# Altium footprint library SCT8-Board.PcbLib: 132 footprints (part 4 of 9)
Each footprint in its own frame and in the unit in brackets; x right, y up, seen from the top. Pads: shape width x height; smd on the part's side, far side on the other; paste and mask are expansions set on the pad; w line width, h text height; cw(c..) or ccw(c..) is an arc to the next point about the centre after c.
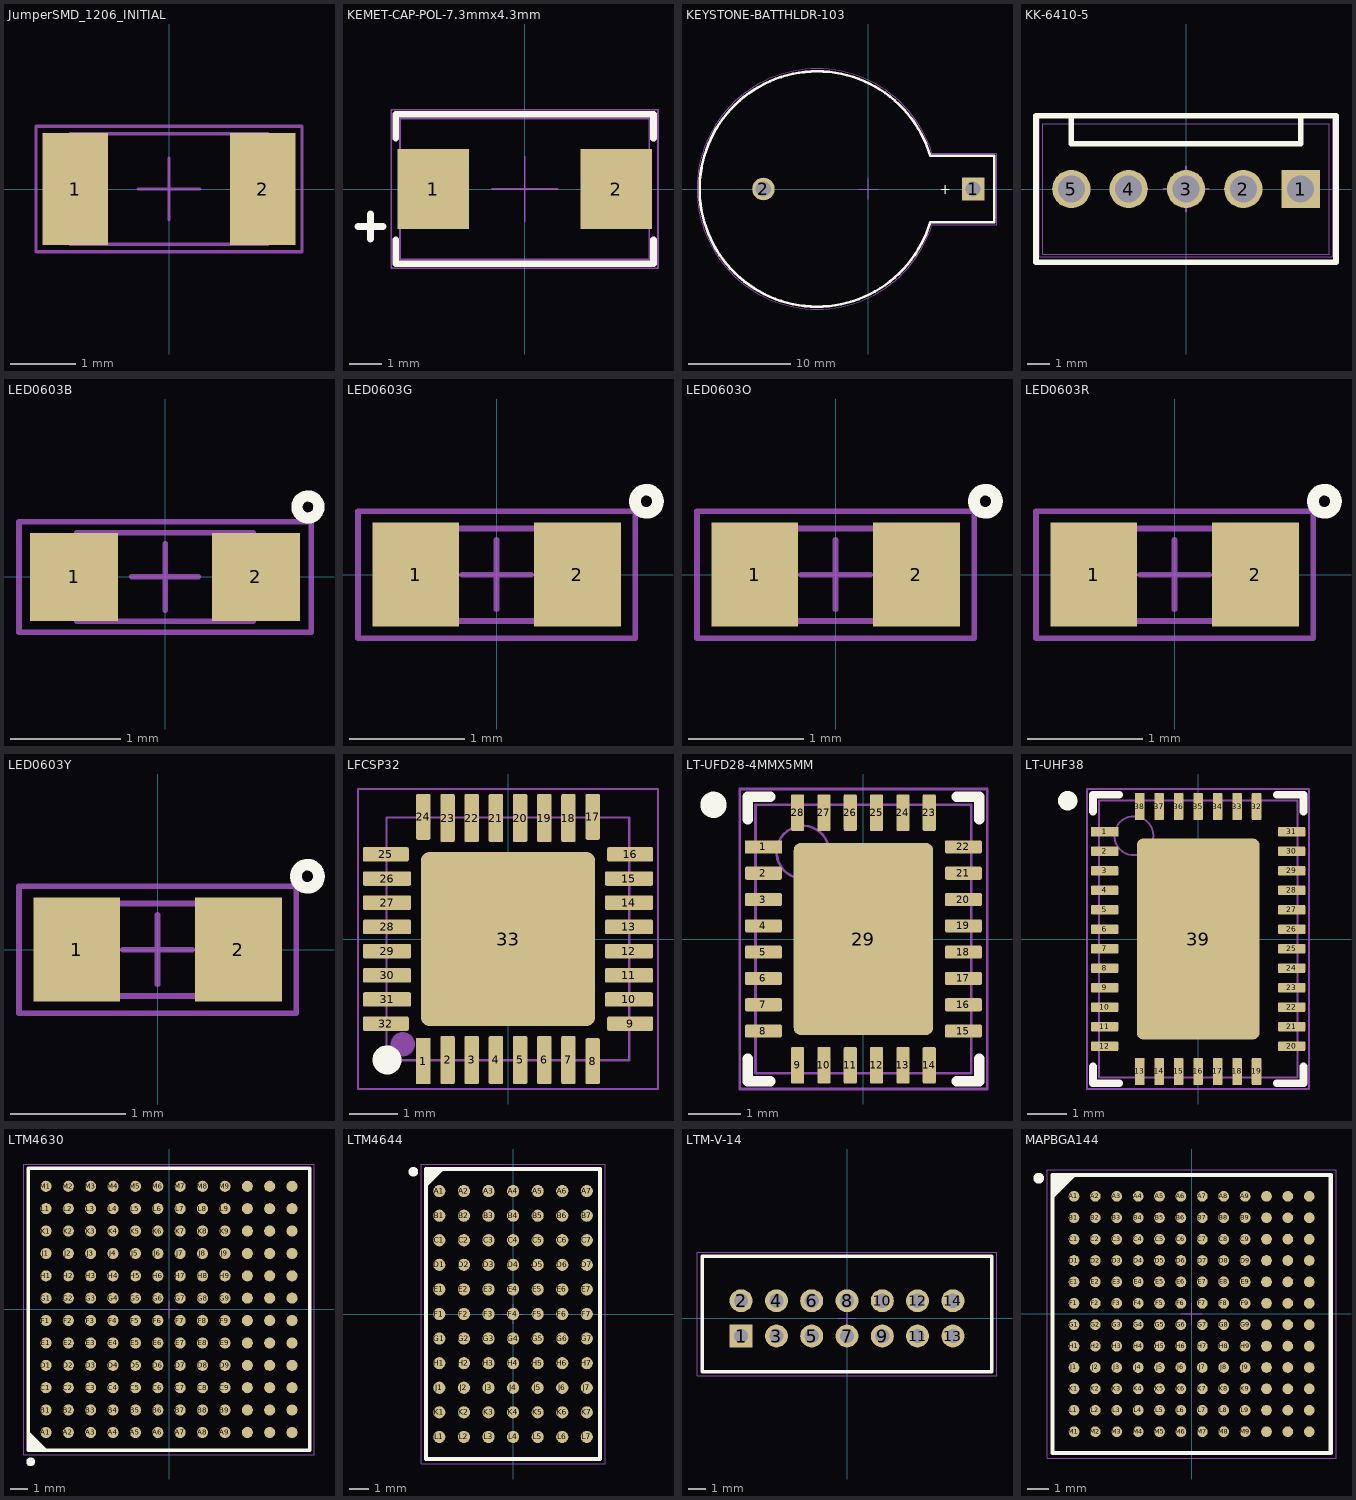
[diagram p3: the footprints below, top view; thin cyan lines are the x and y axes]

## JumperSMD_1206_INITIAL [mm] "Chip Resistor, Body 1.6x0.8mm (LxW typ), IPC High Density"
height 10
pads (2):
  rect 1.01x1.73 smd paste-1 mask+0.05: 1(-1.445,0) 2(1.445,0)
Top Courtyard:
  lines w0.05: -2.05,-0.965 2.05,-0.965 2.05,0.965 -2.05,0.965 -2.05,-0.965
Top Designator:
  text ".Designator" at -1.126,-0.113 h0.5
Top Component Center:
  lines w0.05: -0.475,0 0.475,0 ; 0,-0.475 0,0.475 0,-0.475
Top Component Outline:
  lines w0.05: -1.525,-0.85 1.525,-0.85 1.525,0.85 -1.525,0.85 -1.525,-0.85
3D body "5108.STEP": height 0.71, standoff 0, extent -1.525,-0.85 1.525,0.85

## KEMET-CAP-POL-7.3mmx4.3mm [mm]
pads (2):
  rect 2.179x2.449 smd: 1(-2.786,0) 2(2.786,0)
Top Overlay:
  lines w0.2: -5.08,-1.143 -4.318,-1.143 ; -4.699,-1.524 -4.699,-0.762 ; -3.927,-1.553 -3.927,-2.277 3.927,-2.277 3.927,-1.553 ; -3.927,1.553 -3.927,2.277 3.927,2.277 3.927,1.553
Top Courtyard:
  lines w0.05: -4.064,-2.413 4.064,-2.413 4.064,2.413 -4.064,2.413 -4.064,-2.413
Top Designator:
  text ".Designator" at -2.252,-0.226 h1
Top Component Center:
  lines w0.05: -1,0 1,0 ; 0,-1 0,1
Top Component Outline:
  lines w0.05: -3.8,-2.15 3.8,-2.15 3.8,2.15 -3.8,2.15 -3.8,-2.15
Bottom 3D Body:
  lines w0.1: -5.08,-1.143 -4.318,-1.143 ; -4.699,-1.524 -4.699,-0.762

## KEYSTONE-BATTHLDR-103 [mm]
height 8.5
pads (2):
  rect 2.2x2.2 hole 1.5: 1(10.245,0)
  round 2.2 hole 1.5: 2(-10.245,0)
Top Overlay:
  lines w0.254: 6.044,3.25 12.336,3.25 12.336,-3.25 6.044,-3.25 cw(c-4.987,0) 6.046,3.244
  text "+" at 8.128,0.381 h1
Top Courtyard:
  lines w0.05: 6.229,-3.5 cw(c-4.987,0) 6.229,3.5 12.586,3.5 12.586,-3.5 6.229,-3.5
Top Designator:
  text ".Designator" at -2.252,-0.226 h1
Top 3D Body:
  lines w0.05: 6.044,3.25 12.336,3.25 12.336,-3.25 6.044,-3.25 cw(c-4.987,0) 6.046,3.244
Top Component Center:
  lines w0.1: -0.998,0 1.002,0 ; 0.002,-1 0.002,1
Top Component Outline:
  lines w0.05: 6.044,3.25 12.336,3.25 12.336,-3.25 6.044,-3.25 cw(c-4.987,0) 6.046,3.244
3D body "PN103.STEP": height 8.51, standoff -4.55, extent -16.366,-11.379 12.336,11.379

## KK-6410-5 [mm] "Stiftleiste KK100 Serie 6410-5"
height 11.7
pads (5):
  rect 1.7x1.7 hole 1.2: 1(5.08,0)
  round 1.7 hole 1.2: 2(2.54,0) 3(0,0) 4(-2.54,0) 5(-5.08,0)
Top Overlay:
  lines w0.25: -6.65,3.25 -6.65,-3.25 6.65,-3.25 6.65,3.25 -6.6,3.25 ; -5.08,3.25 -5.08,2 5.08,2 5.08,3.25
Top Courtyard:
  lines w0.05: -6.5,-3 -6.5,3.25 6.5,3.25 6.5,-3 -6.5,-3
Top Designator:
  text ".Designator" at -2.252,-0.226 h1
Top Component Center:
  lines w0.1: -0.998,0 1.002,0 ; 0.002,-1 0.002,1
Top Component Outline:
  lines w0.05: -6.35,-2.9 -6.35,2.9 6.35,2.9 6.35,-2.9 -6.35,-2.9
3D body "022292051.stp": height 11.75, standoff -3.51, extent -6.35,-2.9 6.35,2.9

## LED0603B [mm] "LED, 0603, Blue"
height 0.85
pads (2):
  rect 0.8x0.8 smd: 1(-0.825,0) 2(0.825,0)
Top Overlay:
  circle w0.102: c1.297,0.635 r0.1
Top Courtyard:
  lines w0.05: -1.325,-0.5 1.325,-0.5 1.325,0.5 -1.325,0.5 -1.325,-0.5
Top Designator:
  text ".Designator" at -0.674,-0.068 h0.3
Top Component Center:
  lines w0.05: -0.3,0 0.3,0 ; 0,-0.3 0,0.3
Top Component Outline:
  lines w0.05: -0.8,-0.4 -0.8,0.4 0.8,0.4 0.8,-0.4 -0.8,-0.4
3D body "LED0603B.STEP": height 0.88, standoff 0, extent -0.8,-0.4 0.8,0.4

## LED0603G [mm] "LED, 0603, Green"
height 0.85
pads (2):
  rect 0.75x0.9 smd: 1(-0.7,0) 2(0.7,0)
Top Overlay:
  circle w0.102: c1.297,0.635 r0.1
Top Courtyard:
  lines w0.05: -1.2,-0.55 -1.2,0.55 1.2,0.55 1.2,-0.55 -1.2,-0.55
Top Designator:
  text ".Designator" at -0.674,-0.068 h0.3
Top Component Center:
  lines w0.05: -0.3,0 0.3,0 ; 0,-0.3 0,0.3
Top Component Outline:
  lines w0.05: -0.8,-0.4 0.8,-0.4 0.8,0.4 -0.8,0.4 -0.8,-0.4
3D body "LED0603G.STEP": height 0.88, standoff 0, extent -0.8,-0.4 0.8,0.4

## LED0603O [mm] "LED, 0603, Orange"
height 0.85
pads (2):
  rect 0.75x0.9 smd: 1(-0.7,0) 2(0.7,0)
Top Overlay:
  circle w0.102: c1.297,0.635 r0.1
Top Courtyard:
  lines w0.05: -1.2,-0.55 -1.2,0.55 1.2,0.55 1.2,-0.55 -1.2,-0.55
Top Designator:
  text ".Designator" at -0.674,-0.068 h0.3
Top Component Center:
  lines w0.05: -0.3,0 0.3,0 ; 0,-0.3 0,0.3
Top Component Outline:
  lines w0.05: -0.8,-0.4 0.8,-0.4 0.8,0.4 -0.8,0.4 -0.8,-0.4
3D body "LED0603O.STEP": height 0.88, standoff 0, extent -0.8,-0.4 0.8,0.4

## LED0603R [mm] "LED, 0603, Red"
height 0.85
pads (2):
  rect 0.75x0.9 smd: 1(-0.7,0) 2(0.7,0)
Top Overlay:
  circle w0.102: c1.297,0.635 r0.1
Top Courtyard:
  lines w0.05: -1.2,-0.55 -1.2,0.55 1.2,0.55 1.2,-0.55 -1.2,-0.55
Top Designator:
  text ".Designator" at -0.674,-0.068 h0.3
Top Component Center:
  lines w0.05: -0.3,0 0.3,0 ; 0,-0.3 0,0.3
Top Component Outline:
  lines w0.05: -0.8,-0.4 0.8,-0.4 0.8,0.4 -0.8,0.4 -0.8,-0.4
3D body "LED0603R.STEP": height 0.88, standoff 0, extent -0.8,-0.4 0.8,0.4

## LED0603Y [mm] "LED, 0603, Yellow"
height 0.85
pads (2):
  rect 0.75x0.9 smd: 1(-0.7,0) 2(0.7,0)
Top Overlay:
  circle w0.102: c1.297,0.635 r0.1
Top Courtyard:
  lines w0.05: -1.2,-0.55 -1.2,0.55 1.2,0.55 1.2,-0.55 -1.2,-0.55
Top Designator:
  text ".Designator" at -0.674,-0.068 h0.3
Top Component Center:
  lines w0.05: -0.3,0 0.3,0 ; 0,-0.3 0,0.3
Top Component Outline:
  lines w0.05: -0.8,-0.4 0.8,-0.4 0.8,0.4 -0.8,0.4 -0.8,-0.4
3D body "LED0603Y.STEP": height 0.88, standoff 0, extent -0.8,-0.4 0.8,0.4

## LFCSP32 [mm]
pads (33):
  rect 0.3x0.95 smd paste+0 mask+0.05: 1(-1.75,-2.525)
  rrect25% 0.3x1 smd paste+0 mask+0.05: 2(-1.25,-2.5) 3(-0.75,-2.5) 4(-0.25,-2.5) 5(0.25,-2.5) 6(0.75,-2.5) 7(1.25,-2.5) 18(1.25,2.5) 19(0.75,2.5) 20(0.25,2.5) 21(-0.25,2.5) 22(-0.75,2.5) 23(-1.25,2.5)
  rrect25% 0.3x0.95 smd paste+0 mask+0.05: 8(1.75,-2.525) 17(1.75,2.525) 24(-1.75,2.525)
  rrect25% 0.95x0.3 smd paste+0 mask+0.05: 9(2.525,-1.75) 16(2.525,1.75) 25(-2.525,1.75) 32(-2.525,-1.75)
  rrect25% 1x0.3 smd paste+0 mask+0.05: 10(2.5,-1.25) 11(2.5,-0.75) 12(2.5,-0.25) 13(2.5,0.25) 14(2.5,0.75) 15(2.5,1.25) 26(-2.5,1.25) 27(-2.5,0.75) 28(-2.5,0.25) 29(-2.5,-0.25) 30(-2.5,-0.75) 31(-2.5,-1.25)
  rrect10% 3.6x3.6 smd paste+0 mask+0.05: 33(0,0)
Top Overlay:
  circle w0.3: c-2.5,-2.5 r0.15
Top Courtyard:
  lines w0.05: -3.1,-3.1 -3.1,3.1 3.1,3.1 3.1,-3.1 -3.1,-3.1
Top Designator:
  text ".Designator" at 0.192,-1.912 h0.85
Top Component Center:
  lines w0.05: -0.375,0 0.375,0 ; 0,-0.375 0,0.375
Top Component Outline:
  circle w0.3: c-2.175,-2.175 r0.1
  lines w0.05: -2.51,-2.51 2.51,-2.51 2.51,2.51 -2.51,2.51 -2.51,-2.51
3D body "LFCSP-32.step": height 0.89, standoff -0.04, extent -2.51,-2.51 2.51,2.51

## LT-UFD28-4MMX5MM [mm] "QFN, 28-Leads, Body 4.00x5.00mm, Pitch 0.50mm, Thermal Pad 2.65x3.65mm, IPC High Density"
height 0.8
pads (29):
  rect 0.7x0.25 smd: 1(-1.9,1.75)
  rrect25% 0.7x0.25 smd: 2(-1.9,1.25) 3(-1.9,0.75) 4(-1.9,0.25) 5(-1.9,-0.25) 6(-1.9,-0.75) 7(-1.9,-1.25) 8(-1.9,-1.75) 15(1.9,-1.75) 16(1.9,-1.25) 17(1.9,-0.75) 18(1.9,-0.25) 19(1.9,0.25) 20(1.9,0.75) 21(1.9,1.25) 22(1.9,1.75)
  rrect25% 0.25x0.7 smd: 9(-1.25,-2.4) 10(-0.75,-2.4) 11(-0.25,-2.4) 12(0.25,-2.4) 13(0.75,-2.4) 14(1.25,-2.4) 23(1.25,2.4) 24(0.75,2.4) 25(0.25,2.4) 26(-0.25,2.4) 27(-0.75,2.4) 28(-1.25,2.4)
  rrect10% 2.65x3.65 smd: 29(0,0)
Top Overlay:
  circle w0.25: c-2.85,2.55 r0.125
  lines w0.2: -2.2,-2.275 -2.2,-2.7 -1.775,-2.7 ; -2.2,2.275 -2.2,2.7 -1.775,2.7 ; 1.775,-2.7 2.2,-2.7 2.2,-2.275 ; 1.775,2.7 2.2,2.7 2.2,2.275
Top Courtyard:
  lines w0.05: -2.35,-2.85 -2.35,2.85 2.35,2.85 2.35,-2.85 -2.35,-2.85
Top Designator:
  text ".Designator" at -1.912,-0.192 h0.85
Top Component Center:
  lines w0.05: -0.5,0 0.5,0 ; 0,-0.5 0,0.5
Top Component Outline:
  circle w0.05: c-1.15,1.65 r0.5
  lines w0.05: -2.05,-2.55 -2.05,2.55 2.05,2.55 2.05,-2.55 -2.05,-2.55
3D body: height 0.8, standoff 0, extent -2.05,-2.55 2.05,2.55

## LT-UHF38 [mm] "QFN, 38-Leads, Body 5.00x7.00mm, Pitch 0.50mm, Thermal Pad 3.15x5.15mm, IPC High Density"
height 0.8
pads (39):
  rect 0.7x0.25 smd: 1(-2.4,2.75)
  rrect25% 0.7x0.25 smd: 2(-2.4,2.25) 3(-2.4,1.75) 4(-2.4,1.25) 5(-2.4,0.75) 6(-2.4,0.25) 7(-2.4,-0.25) 8(-2.4,-0.75) 9(-2.4,-1.25) 10(-2.4,-1.75) 11(-2.4,-2.25) 12(-2.4,-2.75) 20(2.4,-2.75) 21(2.4,-2.25) 22(2.4,-1.75) 23(2.4,-1.25) 24(2.4,-0.75) 25(2.4,-0.25) 26(2.4,0.25) 27(2.4,0.75) 28(2.4,1.25) 29(2.4,1.75) 30(2.4,2.25) 31(2.4,2.75)
  rrect25% 0.25x0.7 smd: 13(-1.5,-3.4) 14(-1,-3.4) 15(-0.5,-3.4) 16(0,-3.4) 17(0.5,-3.4) 18(1,-3.4) 19(1.5,-3.4) 32(1.5,3.4) 33(1,3.4) 34(0.5,3.4) 35(0,3.4) 36(-0.5,3.4) 37(-1,3.4) 38(-1.5,3.4)
  rrect10% 3.15x5.15 smd: 39(0,0)
Top Overlay:
  circle w0.25: c-3.35,3.55 r0.125
  lines w0.2: -2.7,-3.275 -2.7,-3.7 -2.025,-3.7 ; -2.7,3.275 -2.7,3.7 -2.025,3.7 ; 2.025,-3.7 2.7,-3.7 2.7,-3.275 ; 2.025,3.7 2.7,3.7 2.7,3.275
Top Courtyard:
  lines w0.05: -2.85,-3.85 2.85,-3.85 2.85,3.85 -2.85,3.85 -2.85,-3.85
Top Designator:
  text ".Designator" at -1.912,-0.192 h0.85
Top Component Center:
  lines w0.05: -0.5,0 0.5,0 ; 0,-0.5 0,0.5
Top Component Outline:
  circle w0.05: c-1.65,2.65 r0.5
  lines w0.05: -2.55,-3.55 -2.55,3.55 2.55,3.55 2.55,-3.55 -2.55,-3.55
3D body: height 0.8, standoff 0, extent -2.55,-3.55 2.55,3.55

## LTM4630 [mm] "BGA, 144-Leads, Body 16.00x16.00mmx5.21mm, Pitch 1.27mm"
height 5.21
pads (144):
  round 0.63 smd: A1(-6.985,-6.985) A2(-5.715,-6.985) A3(-4.445,-6.985) A4(-3.175,-6.985) A5(-1.905,-6.985) A6(-0.635,-6.985) A7(0.635,-6.985) A8(1.905,-6.985) A9(3.175,-6.985) A10(4.445,-6.985) A11(5.715,-6.985) A12(6.985,-6.985) B1(-6.985,-5.715) B2(-5.715,-5.715) B3(-4.445,-5.715) B4(-3.175,-5.715) B5(-1.905,-5.715) B6(-0.635,-5.715) B7(0.635,-5.715) B8(1.905,-5.715) B9(3.175,-5.715) B10(4.445,-5.715) B11(5.715,-5.715) B12(6.985,-5.715) C1(-6.985,-4.445) C2(-5.715,-4.445) C3(-4.445,-4.445) C4(-3.175,-4.445) C5(-1.905,-4.445) C6(-0.635,-4.445) C7(0.635,-4.445) C8(1.905,-4.445) C9(3.175,-4.445) C10(4.445,-4.445) C11(5.715,-4.445) C12(6.985,-4.445) D1(-6.985,-3.175) D2(-5.715,-3.175) D3(-4.445,-3.175) D4(-3.175,-3.175) D5(-1.905,-3.175) D6(-0.635,-3.175) D7(0.635,-3.175) D8(1.905,-3.175) D9(3.175,-3.175) D10(4.445,-3.175) D11(5.715,-3.175) D12(6.985,-3.175) E1(-6.985,-1.905) E2(-5.715,-1.905) E3(-4.445,-1.905) E4(-3.175,-1.905) E5(-1.905,-1.905) E6(-0.635,-1.905) E7(0.635,-1.905) E8(1.905,-1.905) E9(3.175,-1.905) E10(4.445,-1.905) E11(5.715,-1.905) E12(6.985,-1.905) F1(-6.985,-0.635) F2(-5.715,-0.635) F3(-4.445,-0.635) F4(-3.175,-0.635) F5(-1.905,-0.635) F6(-0.635,-0.635) F7(0.635,-0.635) F8(1.905,-0.635) F9(3.175,-0.635) F10(4.445,-0.635) F11(5.715,-0.635) F12(6.985,-0.635) G1(-6.985,0.635) G2(-5.715,0.635) G3(-4.445,0.635) G4(-3.175,0.635) G5(-1.905,0.635) G6(-0.635,0.635) G7(0.635,0.635) G8(1.905,0.635) G9(3.175,0.635) G10(4.445,0.635) G11(5.715,0.635) G12(6.985,0.635) H1(-6.985,1.905) H2(-5.715,1.905) H3(-4.445,1.905) H4(-3.175,1.905) H5(-1.905,1.905) H6(-0.635,1.905) H7(0.635,1.905) H8(1.905,1.905) H9(3.175,1.905) H10(4.445,1.905) H11(5.715,1.905) H12(6.985,1.905) J1(-6.985,3.175) J2(-5.715,3.175) J3(-4.445,3.175) J4(-3.175,3.175) J5(-1.905,3.175) J6(-0.635,3.175) J7(0.635,3.175) J8(1.905,3.175) J9(3.175,3.175) J10(4.445,3.175) J11(5.715,3.175) J12(6.985,3.175) K1(-6.985,4.445) K2(-5.715,4.445) K3(-4.445,4.445) K4(-3.175,4.445) K5(-1.905,4.445) K6(-0.635,4.445) K7(0.635,4.445) K8(1.905,4.445) K9(3.175,4.445) K10(4.445,4.445) K11(5.715,4.445) K12(6.985,4.445) L1(-6.985,5.715) L2(-5.715,5.715) L3(-4.445,5.715) L4(-3.175,5.715) L5(-1.905,5.715) L6(-0.635,5.715) L7(0.635,5.715) L8(1.905,5.715) L9(3.175,5.715) L10(4.445,5.715) L11(5.715,5.715) L12(6.985,5.715) M1(-6.985,6.985) M2(-5.715,6.985) M3(-4.445,6.985) M4(-3.175,6.985) M5(-1.905,6.985) M6(-0.635,6.985) M7(0.635,6.985) M8(1.905,6.985) M9(3.175,6.985) M10(4.445,6.985) M11(5.715,6.985) M12(6.985,6.985)
Top Overlay:
  circle w0.25: c-7.85,-8.65 r0.125
  region: -8,-7 -7,-8 -8,-8
  lines w0.2: -8,-7 -7,-8 ; -8,-8 -8,8 8,8 8,-8 -8,-8
Top Courtyard:
  lines w0.05: -8.25,-8.25 -8.25,8.25 8.25,8.25 8.25,-8.25 -8.25,-8.25
Top Designator:
  text ".Designator" at 0.192,-1.912 h0.85
Top Component Center:
  lines w0.05: -0.5,0 0.5,0 ; 0,-0.5 0,0.5
Top Component Outline:
  lines w0.05: -8,-8 8,-8 8,8 -8,8 -8,-8
3D body: height 5.21, standoff 0.5, extent -8,-8 8,8

## LTM4644 [mm]
height 5.21
pads (77):
  round 0.63 smd: A1(-3.81,6.35) A2(-2.54,6.35) A3(-1.27,6.35) A4(0,6.35) A5(1.27,6.35) A6(2.54,6.35) A7(3.81,6.35) B1(-3.81,5.08) B2(-2.54,5.08) B3(-1.27,5.08) B4(0,5.08) B5(1.27,5.08) B6(2.54,5.08) B7(3.81,5.08) C1(-3.81,3.81) C2(-2.54,3.81) C3(-1.27,3.81) C4(0,3.81) C5(1.27,3.81) C6(2.54,3.81) C7(3.81,3.81) D1(-3.81,2.54) D2(-2.54,2.54) D3(-1.27,2.54) D4(0,2.54) D5(1.27,2.54) D6(2.54,2.54) D7(3.81,2.54) E1(-3.81,1.27) E2(-2.54,1.27) E3(-1.27,1.27) E4(0,1.27) E5(1.27,1.27) E6(2.54,1.27) E7(3.81,1.27) F1(-3.81,0) F2(-2.54,0) F3(-1.27,0) F4(0,0) F5(1.27,0) F6(2.54,0) F7(3.81,0) G1(-3.81,-1.27) G2(-2.54,-1.27) G3(-1.27,-1.27) G4(0,-1.27) G5(1.27,-1.27) G6(2.54,-1.27) G7(3.81,-1.27) H1(-3.81,-2.54) H2(-2.54,-2.54) H3(-1.27,-2.54) H4(0,-2.54) H5(1.27,-2.54) H6(2.54,-2.54) H7(3.81,-2.54) J1(-3.81,-3.81) J2(-2.54,-3.81) J3(-1.27,-3.81) J4(0,-3.81) J5(1.27,-3.81) J6(2.54,-3.81) J7(3.81,-3.81) K1(-3.81,-5.08) K2(-2.54,-5.08) K3(-1.27,-5.08) K4(0,-5.08) K5(1.27,-5.08) K6(2.54,-5.08) K7(3.81,-5.08) L1(-3.81,-6.35) L2(-2.54,-6.35) L3(-1.27,-6.35) L4(0,-6.35) L5(1.27,-6.35) L6(2.54,-6.35) L7(3.81,-6.35)
Top Overlay:
  circle w0.25: c-5.15,7.35 r0.125
  region: -3.671,7.5 -4.5,6.671 -4.5,7.5
  lines w0.2: -4.5,6.671 -3.671,7.5 ; -4.5,-7.5 -4.5,7.5 4.5,7.5 4.5,-7.5 -4.5,-7.5
Top Courtyard:
  lines w0.05: -4.75,-7.75 4.75,-7.75 4.75,7.75 -4.75,7.75 -4.75,-7.75
Top Designator:
  text ".Designator" at -1.912,-0.192 h0.85
Top Component Center:
  lines w0.05: -0.5,0 0.5,0 ; 0,-0.5 0,0.5
Top Component Outline:
  lines w0.05: -4.5,-7.5 -4.5,7.5 4.5,7.5 4.5,-7.5 -4.5,-7.5
3D body: height 5.21, standoff 0.5, extent -4.5,-7.5 4.5,7.5

## LTM-V-14 [mm]
pads (14):
  rect 1.3x1.3 hole 0.8: 1(-6,-1)
  round 1.3 hole 0.8: 2(-6,1) 3(-4,-1) 4(-4,1) 5(-2,-1) 6(-2,1) 7(0,-1) 8(0,1) 9(2,-1) 10(2,1) 11(4,-1) 12(4,1) 13(6,-1) 14(6,1)
Top Overlay:
  lines w0.2: -8.191,-3.015 8.191,-3.015 8.191,3.523 -8.191,3.523 -8.191,-3.015
Top Courtyard:
  lines w0.05: -8.5,-3.25 8.5,-3.25 8.5,3.75 -8.5,3.75 -8.5,-3.25
Top Designator:
  text ".Designator" at -1.912,-0.192 h0.85
Top Component Center:
  lines w0.05: -0.5,0 0.5,0 ; 0,-0.5 0,0.5
Top Component Outline:
  lines w0.05: -8.191,-3.015 8.191,-3.015 8.191,3.523 -8.191,3.523 -8.191,-3.015
3D body "LTMM_107_02_F_D.STEP": height 4.83, standoff -2.97, extent -8.191,-3.015 8.191,3.523

## MAPBGA144 [mm] "NXP BGA, 144-Leads, Body 13.00x13.00mmx1.70mm, Pitch 1.00mm (Document No: 98ASA00222D)"
height 1.7
pads (144):
  round 0.5 smd: A1(-5.5,5.5) A2(-4.5,5.5) A3(-3.5,5.5) A4(-2.5,5.5) A5(-1.5,5.5) A6(-0.5,5.5) A7(0.5,5.5) A8(1.5,5.5) A9(2.5,5.5) A10(3.5,5.5) A11(4.5,5.5) A12(5.5,5.5) B1(-5.5,4.5) B2(-4.5,4.5) B3(-3.5,4.5) B4(-2.5,4.5) B5(-1.5,4.5) B6(-0.5,4.5) B7(0.5,4.5) B8(1.5,4.5) B9(2.5,4.5) B10(3.5,4.5) B11(4.5,4.5) B12(5.5,4.5) C1(-5.5,3.5) C2(-4.5,3.5) C3(-3.5,3.5) C4(-2.5,3.5) C5(-1.5,3.5) C6(-0.5,3.5) C7(0.5,3.5) C8(1.5,3.5) C9(2.5,3.5) C10(3.5,3.5) C11(4.5,3.5) C12(5.5,3.5) D1(-5.5,2.5) D2(-4.5,2.5) D3(-3.5,2.5) D4(-2.5,2.5) D5(-1.5,2.5) D6(-0.5,2.5) D7(0.5,2.5) D8(1.5,2.5) D9(2.5,2.5) D10(3.5,2.5) D11(4.5,2.5) D12(5.5,2.5) E1(-5.5,1.5) E2(-4.5,1.5) E3(-3.5,1.5) E4(-2.5,1.5) E5(-1.5,1.5) E6(-0.5,1.5) E7(0.5,1.5) E8(1.5,1.5) E9(2.5,1.5) E10(3.5,1.5) E11(4.5,1.5) E12(5.5,1.5) F1(-5.5,0.5) F2(-4.5,0.5) F3(-3.5,0.5) F4(-2.5,0.5) F5(-1.5,0.5) F6(-0.5,0.5) F7(0.5,0.5) F8(1.5,0.5) F9(2.5,0.5) F10(3.5,0.5) F11(4.5,0.5) F12(5.5,0.5) G1(-5.5,-0.5) G2(-4.5,-0.5) G3(-3.5,-0.5) G4(-2.5,-0.5) G5(-1.5,-0.5) G6(-0.5,-0.5) G7(0.5,-0.5) G8(1.5,-0.5) G9(2.5,-0.5) G10(3.5,-0.5) G11(4.5,-0.5) G12(5.5,-0.5) H1(-5.5,-1.5) H2(-4.5,-1.5) H3(-3.5,-1.5) H4(-2.5,-1.5) H5(-1.5,-1.5) H6(-0.5,-1.5) H7(0.5,-1.5) H8(1.5,-1.5) H9(2.5,-1.5) H10(3.5,-1.5) H11(4.5,-1.5) H12(5.5,-1.5) J1(-5.5,-2.5) J2(-4.5,-2.5) J3(-3.5,-2.5) J4(-2.5,-2.5) J5(-1.5,-2.5) J6(-0.5,-2.5) J7(0.5,-2.5) J8(1.5,-2.5) J9(2.5,-2.5) J10(3.5,-2.5) J11(4.5,-2.5) J12(5.5,-2.5) K1(-5.5,-3.5) K2(-4.5,-3.5) K3(-3.5,-3.5) K4(-2.5,-3.5) K5(-1.5,-3.5) K6(-0.5,-3.5) K7(0.5,-3.5) K8(1.5,-3.5) K9(2.5,-3.5) K10(3.5,-3.5) K11(4.5,-3.5) K12(5.5,-3.5) L1(-5.5,-4.5) L2(-4.5,-4.5) L3(-3.5,-4.5) L4(-2.5,-4.5) L5(-1.5,-4.5) L6(-0.5,-4.5) L7(0.5,-4.5) L8(1.5,-4.5) L9(2.5,-4.5) L10(3.5,-4.5) L11(4.5,-4.5) L12(5.5,-4.5) M1(-5.5,-5.5) M2(-4.5,-5.5) M3(-3.5,-5.5) M4(-2.5,-5.5) M5(-1.5,-5.5) M6(-0.5,-5.5) M7(0.5,-5.5) M8(1.5,-5.5) M9(2.5,-5.5) M10(3.5,-5.5) M11(4.5,-5.5) M12(5.5,-5.5)
Top Overlay:
  circle w0.25: c-7.15,6.35 r0.125
  region: -5.5,6.5 -6.5,5.5 -6.5,6.5
  lines w0.2: -6.5,5.5 -5.5,6.5 ; -6.5,-6.5 -6.5,6.5 6.5,6.5 6.5,-6.5 -6.5,-6.5
Top Courtyard:
  lines w0.05: -6.75,-6.75 -6.75,6.75 6.75,6.75 6.75,-6.75 -6.75,-6.75
Top Designator:
  text ".Designator" at -1.912,-0.192 h0.85
Top Component Center:
  lines w0.05: -0.5,0 0.5,0 ; 0,-0.5 0,0.5
Top Component Outline:
  lines w0.05: -6.5,-6.5 6.5,-6.5 6.5,6.5 -6.5,6.5 -6.5,-6.5
3D body: height 1.7, standoff 0.29, extent -6.5,-6.5 6.5,6.5